# Altium footprint library MyPcbLib.PcbLib: 657 footprints (part 16 of 42)
Each footprint in its own frame and in the unit in brackets; x right, y up, seen from the top. Pads: shape width x height; smd on the part's side, far side on the other; paste and mask are expansions set on the pad; w line width, h text height; cw(c..) or ccw(c..) is an arc to the next point about the centre after c.
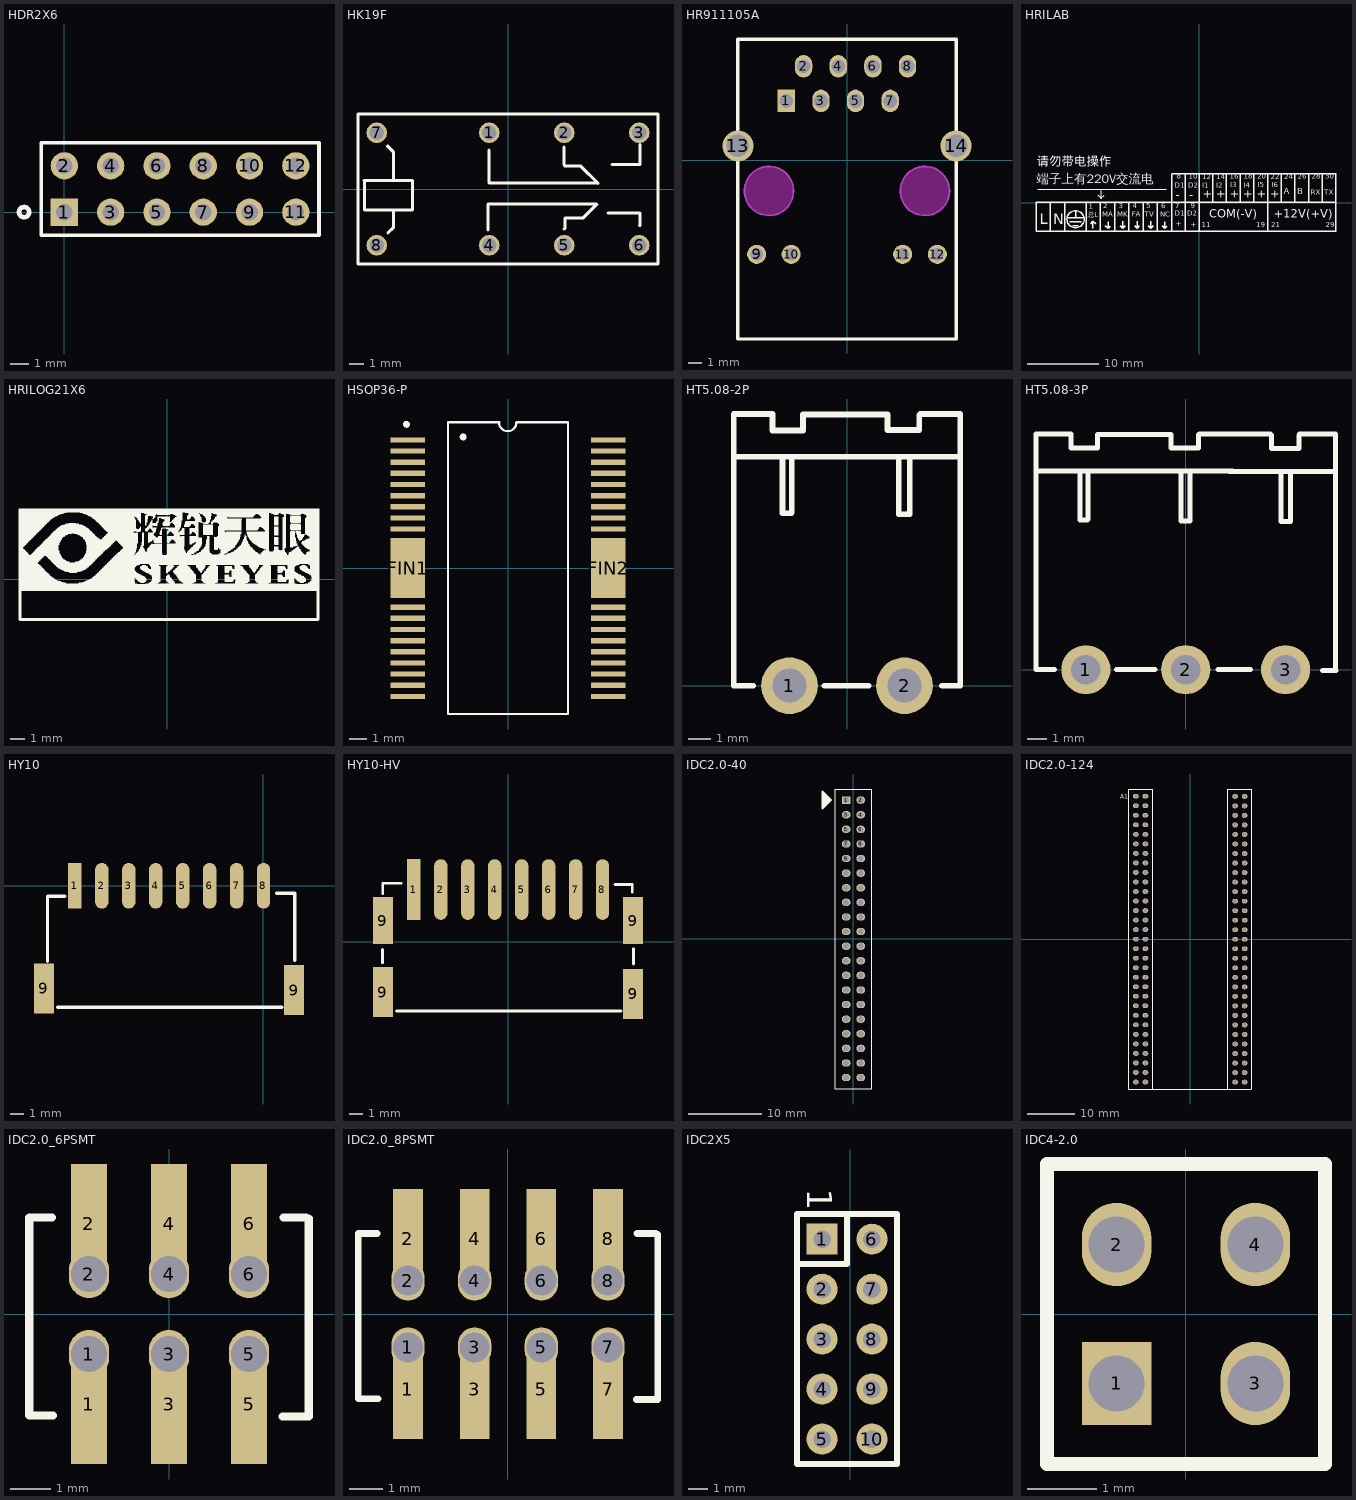
[diagram p15: the footprints below, top view; thin cyan lines are the x and y axes]

## HDR2X6 [mm] "Connector; Header; 6x2 Position"
pads (12):
  rect 1.5x1.5 hole 0.9: 1(0,0)
  round 1.5 hole 0.9: 2(0,2.54) 3(2.54,0) 4(2.54,2.54) 5(5.08,0) 6(5.08,2.54) 7(7.62,0) 8(7.62,2.54) 9(10.16,0) 10(10.16,2.54) 11(12.7,0) 12(12.7,2.54)
Top Overlay:
  circle w0.254: c-2.21,0 r0.279
  lines w0.2: -1.27,-1.27 -1.27,3.81 13.97,3.81 13.97,-1.27 -1.27,-1.27

## HK19F [mm]
pads (8):
  round 1.4 hole 1: 1(-1.27,3.81) 2(3.81,3.81) 3(8.89,3.81) 4(-1.27,-3.81) 5(3.81,-3.81) 6(8.89,-3.81) 7(-8.89,3.81) 8(-8.89,-3.81)
Top Overlay:
  lines w0.203: -9.754,0.584 -9.728,0.559 -9.728,-1.422 -6.477,-1.422 -6.477,0.584 -9.677,0.584 ; -8.179,2.921 -7.772,2.515 -7.772,0.584 ; -8.128,-2.972 -7.772,-2.616 -7.772,-1.524 ; -1.346,-2.794 -1.346,-1.016 5.994,-1.016 ; -1.295,2.642 -1.295,0.406 6.096,0.406 ; 3.81,-2.718 3.861,-2.667 3.861,-1.956 5.105,-1.956 6.02,-1.041 ; 3.81,1.651 3.81,2.845 ; 3.835,1.575 4.902,1.575 6.096,0.381 ; 6.782,-1.626 8.941,-1.626 8.941,-2.464 8.915,-2.489 ; 7.061,1.651 8.941,1.651 8.941,3.023 ; -10.16,-5.08 10.16,-5.08 10.16,5.08 -10.16,5.08 -10.16,-5.08

## HR911105A [mm] "HR911105A"
pads (14):
  rect 1.27x1.651 hole 1.016: 1(-4.45,4.355)
  oval 1.27x1.651 hole 1.016: 2(-3.18,6.895) 3(-1.91,4.355) 4(-0.64,6.895) 5(0.63,4.355) 6(1.9,6.895) 7(3.17,4.355) 8(4.44,6.895)
  round 1.4 hole 0.914: 9(-6.625,-6.895) 10(-4.094,-6.895) 11(4.081,-6.895) 12(6.624,-6.895)
  round 2.286 hole 1.651: 13(-8,1.055) 14(8,1.055)
Top Overlay:
  lines w0.254: -8.006,8.895 -8,8.889 ; 7.996,8.895 8,8.891 ; -8,8.889 -7.998,8.891 8,8.891 ; -8,8.889 -8,1.055 -8,-13.099 -8.006,-13.105 7.996,-13.105 8,-13.101 8,1.055 8,8.891
Keep-Out Layer:
  board cut-out: -5.72,-4.056 -6.073,-4.021 -6.412,-3.918 -6.724,-3.751 -6.998,-3.527 -7.222,-3.253 -7.389,-2.941 -7.492,-2.602 -7.527,-2.249 -7.492,-1.896 -7.389,-1.557 -7.222,-1.245 -6.998,-0.971 -6.724,-0.747 -6.412,-0.58 -6.073,-0.477 -5.72,-0.442 -5.367,-0.477 -5.028,-0.58 -4.716,-0.747 -4.442,-0.971 -4.218,-1.245 -4.051,-1.557 -3.948,-1.896 -3.913,-2.249 -3.948,-2.602 -4.051,-2.941 -4.218,-3.253 -4.442,-3.527 -4.716,-3.751 -5.028,-3.918 -5.367,-4.021
  board cut-out: 3.903,-2.249 3.938,-2.602 4.041,-2.941 4.208,-3.253 4.432,-3.527 4.706,-3.751 5.018,-3.918 5.357,-4.021 5.71,-4.056 6.063,-4.021 6.402,-3.918 6.714,-3.751 6.988,-3.527 7.212,-3.253 7.379,-2.941 7.482,-2.602 7.517,-2.249 7.482,-1.896 7.379,-1.557 7.212,-1.245 6.988,-0.971 6.714,-0.747 6.402,-0.58 6.063,-0.477 5.71,-0.442 5.357,-0.477 5.018,-0.58 4.706,-0.747 4.432,-0.971 4.208,-1.245 4.041,-1.557 3.938,-1.896
Keep-Out Layer:
  circle w0.127: c5.71,-2.249 r1.798
  circle w0.127: c-5.72,-2.249 r1.798
Mechanical 1:
  circle w0.127: c-5.72,-2.249 r1.798
  circle w0.127: c5.71,-2.249 r1.798
3D body: height 13.5, standoff -3, extent -8.535,-12.913 8.585,8.687

## HRILAB [mm]
Top Overlay:
  circle w0.203: c-17.323,-2.286 r1.2
  lines w0.127: -22.581,1.905 -4.648,1.905 ; -14.224,1.143 -13.716,0.635 -13.716,1.88 ; -13.767,0.635 -13.31,1.092
  lines w0.203: -20.86,-3.861 -20.86,0.025 ; -18.86,-3.835 -18.86,0 ; -18.473,-2.083 -16.173,-2.083 ; -18.123,-2.642 -16.523,-2.642 ; -17.723,-3.175 -16.923,-3.175 ; -17.323,-2.086 -17.323,-1.086 ; -15.86,-3.937 -15.86,0 ; -15.215,-2.921 -14.884,-2.591 ; -14.884,-3.556 -14.884,-2.591 ; -14.529,-2.946 -14.884,-2.591 ; -13.86,-3.886 -13.86,0.063 ; -13.132,-3.226 -12.776,-3.581 ; -12.776,-2.616 -12.776,-3.581 ; -12.446,-3.251 -12.776,-3.581 ; -11.86,-3.937 -11.86,-0.025 ; -11.049,-3.175 -10.693,-3.531 ; -10.693,-2.565 -10.693,-3.531 ; -10.363,-3.2 -10.693,-3.531 ; -9.86,-3.861 -9.86,0.025 ; -9.068,-3.175 -8.712,-3.531 ; -8.712,-2.565 -8.712,-3.531 ; -8.382,-3.2 -8.712,-3.531 ; -7.86,-3.81 -7.86,0.102 ; -7.137,-3.175 -6.782,-3.531 ; -6.782,-2.565 -6.782,-3.531 ; -6.452,-3.2 -6.782,-3.531 ; -5.86,-3.886 -5.86,0.025 ; -5.207,-3.226 -4.851,-3.581 ; -4.851,-2.616 -4.851,-3.581 ; -4.521,-3.251 -4.851,-3.581 ; -3.86,-3.937 -3.86,4.039 ; -3.86,4.063 19.14,4.063 19.14,-3.937 -22.86,-3.937 -22.86,0.063 19.14,0.063 ; -1.943,-3.886 -1.943,4.063 ; -0.027,-3.861 -0.027,3.988 ; 1.89,0.063 1.89,4.013 ; 3.807,0.063 3.807,4.013 ; 5.723,0.063 5.723,4.064 ; 7.64,0.063 7.64,4.064 ; 9.557,-3.937 9.557,4.063 ; 11.473,0.063 11.473,4.013 ; 13.39,0.063 13.39,4.013 ; 15.307,0.063 15.307,4.039 ; 17.223,0.063 17.223,4.063
  text "1" at -15.469,-1.092 h1.2
  text "2" at -13.411,-1.041 h1.2
  text "3" at -11.303,-1.048 h1.2
  text "4" at -9.296,-1.048 h1.2
  text "5" at -7.442,-1.048 h1.2
  text "6" at -5.309,-1.048 h1.2
  text "+12V(+V)" at 10.414,-2.515 h2
  text "RX" at 15.612,0.838 h1.2
  text "TX" at 17.501,0.838 h1.2
  text "B" at 13.723,0.838 h1.5
  text "A" at 11.834,0.838 h1.5
  text "COM(-V)" at 1.397,-2.515 h2
  text "+" at -1.168,-3.658 h1.2
  text "+" at -3.327,-3.581 h1.2
  text "D2" at -1.651,-2.057 h1.2
  text "D1" at -3.404,-2.057 h1.2
  text "+" at 9.945,0.327 h2
  text "+" at 8.056,0.327 h2
  text "+" at 6.168,0.327 h2
  text "+" at 4.279,0.327 h2
  text "+" at 2.39,0.327 h2
  text "+" at 0.501,0.327 h2
  text "-" at -1.388,0.149 h2
  text "-" at -3.277,0.149 h2
  text "I6" at 10.135,1.88 h1.2
  text "I5" at 8.193,1.88 h1.2
  text "I4" at 6.252,1.867 h1.2
  text "I3" at 4.311,1.88 h1.2
  text "I2" at 2.369,1.867 h1.2
  text "I1" at 0.428,1.867 h1.2
  text "D2" at -1.513,1.867 h1.2
  text "D1" at -3.454,1.867 h1.2
  text "NC" at -5.486,-2.21 h1.2
  text "TV" at -7.62,-2.216 h1.2
  text "FA" at -9.474,-2.216 h1.2
  text "MK" at -11.481,-2.216 h1.2
  text "MA" at -13.589,-2.21 h1.2
  text "总L" at -15.646,-2.261 h1.2
  text "N" at -20.472,-3.461 h2.54
  text "L" at -22.327,-3.461 h2.54
  text "8" at -3.15,3.099 h1.2
  text "10" at -1.469,3.073 h1.2
  text "12" at 0.441,3.061 h1.2
  text "14" at 2.351,3.061 h1.2
  text "16" at 4.26,3.073 h1.2
  text "18" at 6.195,3.073 h1.2
  text "20" at 8.104,3.073 h1.2
  text "22" at 10.013,3.061 h1.2
  text "24" at 11.923,3.061 h1.2
  text "26" at 13.807,3.073 h1.2
  text "28" at 15.717,3.073 h1.2
  text "30" at 17.628,3.073 h1.2
  text "29" at 17.678,-3.708 h1.2
  text "21" at 10.064,-3.721 h1.2
  text "19" at 8.002,-3.708 h1.2
  text "11" at 0.339,-3.721 h1.2
  text "9" at -1.219,-1.048 h1.2
  text "7" at -3.353,-1.048 h1.2
  text "端子上有220V交流电" at -22.733,2.311 h2.2
  text "请勿带电操作" at -22.733,4.811 h2.2

## HRILOG21X6 [mm]
Top Overlay:
  drawing of 2985 lines, arcs and shapes, not listed

## HSOP36-P [mm]
pads (38):
  rect 2x0.305 smd: 1(-5.85,7.475) 2(-5.85,6.825) 3(-5.85,6.175) 4(-5.85,5.525) 5(-5.85,4.875) 6(-5.85,4.225) 7(-5.85,3.575) 8(-5.85,2.925) 9(-5.85,2.275) 10(-5.85,-2.275) 11(-5.85,-2.925) 12(-5.85,-3.575) 13(-5.85,-4.225) 14(-5.85,-4.875) 15(-5.85,-5.525) 16(-5.85,-6.175) 17(-5.85,-6.825) 18(-5.85,-7.475) 19(5.85,-7.475) 20(5.85,-6.825) 21(5.85,-6.175) 22(5.85,-5.525) 23(5.85,-4.875) 24(5.85,-4.225) 25(5.85,-3.575) 26(5.85,-2.925) 27(5.85,-2.275) 28(5.85,2.275) 29(5.85,2.925) 30(5.85,3.575) 31(5.85,4.225) 32(5.85,4.875) 33(5.85,5.525) 34(5.85,6.175) 35(5.85,6.825) 36(5.85,7.475)
  rect 2x3.5 smd: FIN1(-5.85,0) FIN2(5.85,0)
Top Overlay:
  circle w0.2: c-5.917,8.382 r0.1
  circle w0.2: c-2.615,7.645 r0.1
  lines w0.127: -0.517,8.484 ccw(c-0.017,8.484) 0.483,8.484 ; -0.5,8.5 -3.5,8.5 -3.5,-8.5 3.5,-8.5 3.5,8.5 0.5,8.5

## HT5.08-2P [mm]
pads (2):
  round 2.5 hole 1.5: 1(-2.546,0.001) 2(2.534,0.001)
Top Overlay:
  lines w0.254: -5.006,10.11 4.917,10.11 ; -4.147,0.001 -5.006,0.001 -5.006,12.001 -3.297,12.001 -3.297,11.268 -1.951,11.268 -1.951,11.976 1.783,11.976 1.783,11.29 3.18,11.29 3.18,11.95 3.231,12.001 4.994,12.001 4.994,0.001 4.185,0.001 ; -2.851,10.11 -2.851,7.621 -2.47,7.621 -2.445,7.647 -2.445,10.11 ; -0.997,0.001 0.959,0.001 ; 2.28,10.11 2.28,7.57 2.762,7.57 2.711,7.621 ; 2.762,7.621 2.762,10.11
3D body: height 8.25, standoff -1.14, extent -5.025,-1.397 4.975,10.603

## HT5.08-3P [mm]
pads (3):
  round 2.5 hole 1.5: 1(-5.08,0) 2(0,0) 3(5.08,0)
Top Overlay:
  lines w0.254: -7.62,0 -7.62,12 ; -7.54,0 -6.68,0 ; -7.54,10.109 2.384,10.109 ; -7.54,12 -5.831,12 -5.831,11.266 -4.485,11.266 -4.485,11.975 -0.751,11.975 -0.751,11.289 0.646,11.289 0.646,11.949 0.697,12 2.46,12 ; -5.385,10.109 -5.385,7.62 -5.004,7.62 -4.978,7.645 -4.978,10.109 ; -3.531,0 -1.575,0 ; -0.254,10.109 -0.254,7.569 0.229,7.569 0.178,7.62 ; 0.229,7.62 0.229,10.109 ; 1.651,0 3.302,0 ; 2.235,10.084 7.569,10.084 ; 2.362,11.989 4.318,11.989 ; 4.355,11.949 4.355,11.263 5.752,11.263 5.752,11.924 5.802,11.975 ; 4.851,10.084 4.851,7.544 5.334,7.544 5.283,7.595 ; 5.334,7.595 5.334,10.084 ; 5.791,11.989 7.595,11.989 ; 6.96,-0.051 7.645,-0.051 ; 7.62,0 7.62,12
3D body: height 0.69, standoff -8.7, extent -7.696,-1.422 7.544,10.578

## HY10 [mm]
height 11.5
pads (10):
  rect 1x3.4 smd: 1(-13.97,0)
  oval 1x3.4 smd: 2(-11.97,0) 3(-9.97,0) 4(-7.97,0) 5(-5.97,0) 6(-3.97,0) 7(-1.97,0) 8(0.03,0)
  rect 1.5x3.7 smd: 9(-16.27,-7.62) 9(2.3,-7.747)
Top Overlay:
  lines w0.254: -16.002,-5.588 -16.002,-0.889 ; -16.002,-0.762 -14.707,-0.762 ; -15.24,-9.017 1.397,-9.017 ; 1.005,-0.559 2.3,-0.559 ; 2.337,-5.512 2.337,-0.559

## HY10-HV [mm] "立式,卧式通用"
height 11.5
pads (12):
  rect 1x4.5 smd: 1(-6.985,3.873)
  oval 1x4.5 smd: 2(-4.985,3.873) 3(-2.985,3.873) 4(-0.985,3.873) 5(1.015,3.873) 6(3.015,3.873) 7(5.015,3.873) 8(7.015,3.873)
  rect 1.5x3.7 smd: 9(-9.285,-3.746) 9(9.285,-3.873)
  rect 1.5x3.5 smd: 9(-9.285,1.562) 9(9.285,1.562)
Top Overlay:
  lines w0.203: -9.322,-1.562 -9.322,-0.572 ; -9.296,3.569 -9.296,4.331 -7.925,4.331 ; 7.95,4.255 9.22,4.255 9.22,3.67 ; 9.322,-1.664 9.322,-0.521
  lines w0.254: -8.255,-5.143 8.382,-5.143

## IDC2.0-40 [mm]
pads (40):
  rect 1.2x1 hole 0.8: 1(-1,19)
  oval 1.2x1 hole 0.8: 2(1,19) 3(-1,17) 4(1,17) 5(-1,15) 6(1,15) 7(-1,13) 8(1,13) 9(-1,11) 10(1,11) 11(-1,9) 12(1,9) 13(-1,7) 14(1,7) 15(-1,5) 16(1,5) 17(-1,3) 18(1,3) 19(-1,1) 20(1,1) 21(-1,-1) 22(1,-1) 23(-1,-3) 24(1,-3) 25(-1,-5) 26(1,-5) 27(-1,-7) 28(1,-7) 29(-1,-9) 30(1,-9) 31(-1,-11) 32(1,-11) 33(-1,-13) 34(1,-13) 35(-1,-15) 36(1,-15) 37(-1,-17) 38(1,-17) 39(-1,-19) 40(1,-19)
Top Overlay:
  lines w0.127: -2.5,-20.564 -2.5,20.5 ; -2.5,20.524 2.5,20.524 ; -2.489,-20.537 2.489,-20.537 ; 2.5,-20.564 2.5,20.5
  lines w0.254: -4.267,17.831 -3.099,18.999 ; -4.267,17.882 -4.267,20.218 -3.099,19.05 ; -4.089,18.161 -4.089,19.939 ; -3.912,18.263 -3.912,19.761 ; -3.734,18.491 -3.734,19.583 ; -3.556,18.669 -3.556,19.406 ; -3.404,18.898 -3.404,19.279 ; -3.251,18.923 -3.251,19.075

## IDC2.0-124 [mm]
pads (124):
  oval 1.2x1 hole 0.8: 1(-11.414,30.012) 2(-9.414,30.012) 3(-11.414,28.012) 4(-9.414,28.012) 5(-11.414,26.012) 6(-9.414,26.012) 7(-11.414,24.012) 8(-9.414,24.012) 9(-11.414,22.012) 10(-9.414,22.012) 11(-11.414,20.012) 12(-9.414,20.012) 13(-11.414,18.012) 14(-9.414,18.012) 15(-11.414,16.012) 16(-9.414,16.012) 17(-11.414,14.012) 18(-9.414,14.012) 19(-11.414,12.012) 20(-9.414,12.012) 21(-11.414,10.012) 22(-9.414,10.012) 23(-11.414,8.012) 24(-9.414,8.012) 25(-11.414,6.012) 26(-9.414,6.012) 27(-11.414,4.012) 28(-9.414,4.012) 29(-11.414,2.012) 30(-9.414,2.012) 31(-11.414,0.012) 32(-9.414,0.012) 33(-11.414,-1.988) 34(-9.414,-1.988) 35(-11.414,-3.988) 36(-9.414,-3.988) 37(-11.414,-5.988) 38(-9.414,-5.988) 39(-11.414,-7.988) 40(-9.414,-7.988) 41(-11.414,-9.988) 42(-9.414,-9.988) 43(-11.414,-11.988) 44(-9.414,-11.988) 45(-11.414,-13.988) 46(-9.414,-13.988) 47(-11.414,-15.988) 48(-9.414,-15.988) 49(-11.414,-17.988) 50(-9.414,-17.988) 51(-11.414,-19.988) 52(-9.414,-19.988) 53(-11.414,-21.988) 54(-9.414,-21.988) 55(-11.414,-23.988) 56(-9.414,-23.988) 57(-11.414,-25.988) 58(-9.414,-25.988) 59(-11.414,-27.988) 60(-9.414,-27.988) 61(-11.414,-29.988) 62(-9.414,-29.988) 63(9.414,29.988) 64(11.414,29.988) 65(9.414,27.988) 66(11.414,27.988) 67(9.414,25.988) 68(11.414,25.988) 69(9.414,23.988) 70(11.414,23.988) 71(9.414,21.988) 72(11.414,21.988) 73(9.414,19.988) 74(11.414,19.988) 75(9.414,17.988) 76(11.414,17.988) 77(9.414,15.988) 78(11.414,15.988) 79(9.414,13.988) 80(11.414,13.988) 81(9.414,11.988) 82(11.414,11.988) 83(9.414,9.988) 84(11.414,9.988) 85(9.414,7.988) 86(11.414,7.988) 87(9.414,5.988) 88(11.414,5.988) 89(9.414,3.988) 90(11.414,3.988) 91(9.414,1.988) 92(11.414,1.988) 93(9.414,-0.012) 94(11.414,-0.012) 95(9.414,-2.012) 96(11.414,-2.012) 97(9.414,-4.012) 98(11.414,-4.012) 99(9.414,-6.012) 100(11.414,-6.012) 101(9.414,-8.012) 102(11.414,-8.012) 103(9.414,-10.012) 104(11.414,-10.012) 105(9.414,-12.012) 106(11.414,-12.012) 107(9.414,-14.012) 108(11.414,-14.012) 109(9.414,-16.012) 110(11.414,-16.012) 111(9.414,-18.012) 112(11.414,-18.012) 113(9.414,-20.012) 114(11.414,-20.012) 115(9.414,-22.012) 116(11.414,-22.012) 117(9.414,-24.012) 118(11.414,-24.012) 119(9.414,-26.012) 120(11.414,-26.012) 121(9.414,-28.012) 122(11.414,-28.012) 123(9.414,-30.012) 124(11.414,-30.012)
Top Overlay:
  lines w0.127: -12.938,-31.456 -7.914,-31.456 -7.914,31.512 ; -12.914,-31.456 -12.914,31.512 ; -12.914,31.536 -7.914,31.536 ; -7.858,-31.456 12.843,-31.456 ; 7.865,31.485 12.945,31.485 ; 7.914,-31.431 7.914,31.512 ; 12.914,-31.456 12.914,31.512
  text "A1" at -14.732,29.464 h0.89

## IDC2.0_6PSMT [mm]
pads (12):
  rect 0.89x3 smd: 1(-2,-2.25) 2(-2,2.25) 3(0,-2.25) 4(0,2.25) 5(2,-2.25) 6(2,2.25)
  oval 1x1.2 hole 0.9: 1(-2,-1) 2(-2,1) 3(0,-1) 4(0,1) 5(2,-1) 6(2,1)
Top Overlay:
  lines w0.203: -2.925,2.413 -3.492,2.413 -3.492,-2.54 -2.899,-2.54 ; 2.841,-2.565 3.449,-2.565 ; 2.866,2.413 3.425,2.413 3.449,2.389 ; 3.492,-2.565 3.492,2.389

## IDC2.0_8PSMT [mm]
pads (16):
  rect 0.89x3 smd: 1(-3,-2.25) 2(-3,2.25) 3(-1,-2.25) 4(-1,2.25) 5(1,-2.25) 6(1,2.25) 7(3,-2.25) 8(3,2.25)
  oval 1x1.2 hole 0.9: 1(-3,-1) 2(-3,1) 3(-1,-1) 4(-1,1) 5(1,-1) 6(1,1) 7(3,-1) 8(3,1)
Top Overlay:
  lines w0.203: -3.925,2.413 -4.492,2.413 -4.492,-2.54 -3.899,-2.54 ; 3.848,-2.565 4.456,-2.565 ; 3.873,2.413 4.432,2.413 4.456,2.389 ; 4.492,-2.565 4.492,2.389

## IDC2X5 [mil]
pads (10):
  rect 62x62 hole 35: 1(-57,731.5)
  round 62 hole 35: 2(-57,631.5) 3(-57,531.5) 4(-57,431.5) 5(-57,331.5) 6(43,731.5) 7(43,631.5) 8(43,531.5) 9(43,431.5) 10(43,331.5)
Top Overlay:
  lines w12: -107,681.5 -7,681.5 -7,781.5 ; -107,281.5 93,281.5 93,781.5 -107,781.5 -107,281.5
  text "1" at -86.53,831.89 h50

## IDC4-2.0 [mm]
pads (4):
  rect 1x1.2 hole 0.8: 1(-1,-1)
  oval 1x1.2 hole 0.8: 2(-1,1) 3(1,-1) 4(1,1)
Top Overlay:
  lines w0.203: -2,-2.159 -2,2.159 2,2.159 2,-2.159 -2,-2.159